# Altium footprint library MyPcb.PcbLib: 367 footprints (part 7 of 23)
Each footprint in its own frame and in the unit in brackets; x right, y up, seen from the top. Pads: shape width x height; smd on the part's side, far side on the other; paste and mask are expansions set on the pad; w line width, h text height; cw(c..) or ccw(c..) is an arc to the next point about the centre after c.
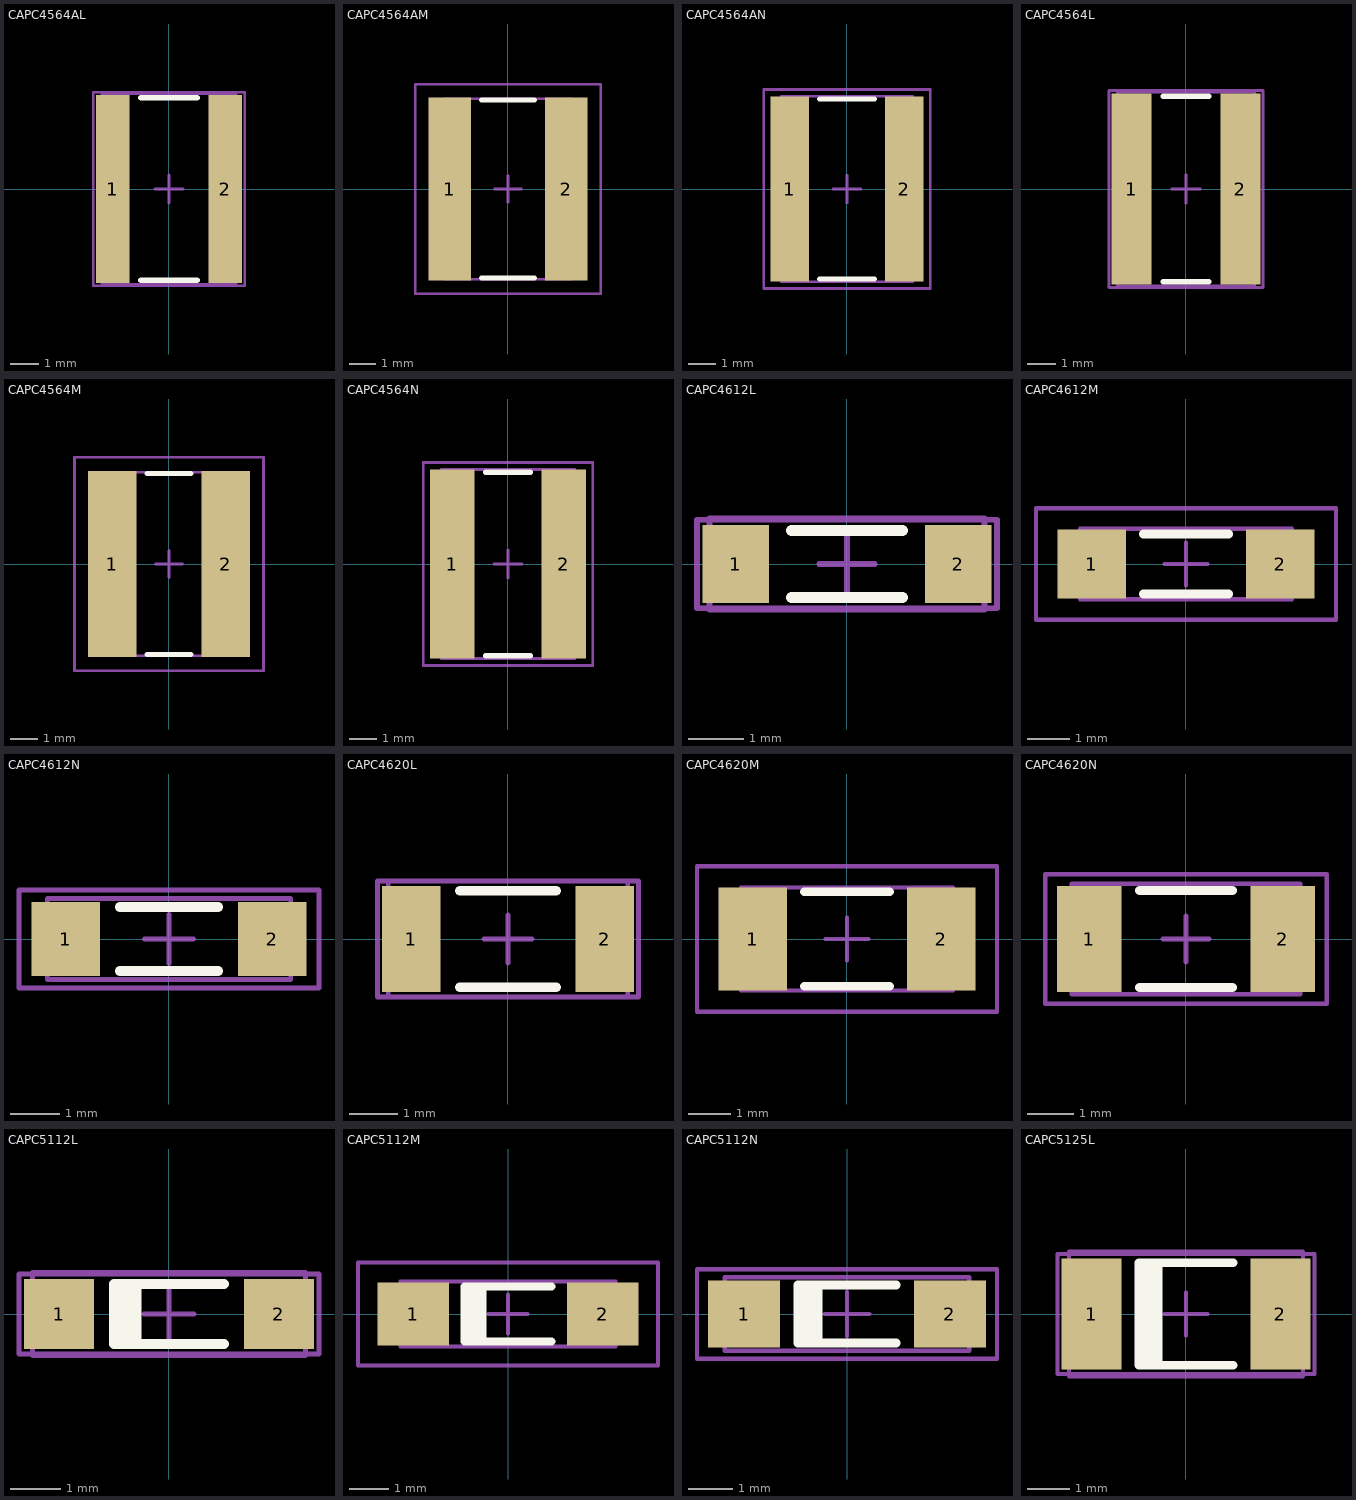
[diagram p6: the footprints below, top view; thin cyan lines are the x and y axes]

## CAPC4564AL [mm] "Chip Capacitor, Body 4.5x6.4mm, IPC High Density"
height 2.03
pads (2):
  rect 1.2x6.7 smd: 1(-2,0) 2(2,0)
Top Overlay:
  lines w0.2: -1,-3.25 1,-3.25 ; -1,3.25 1,3.25
Mechanical 13:
  lines w0.1: -2.4,-3.4 -2.4,3.4 2.4,3.4 2.4,-3.4 -2.4,-3.4
Mechanical 15:
  lines w0.1: -0.5,0 0.5,0 ; 0,-0.5 0,0.5 ; -2.7,-3.45 -2.7,3.45 2.7,3.45 2.7,-3.45 -2.7,-3.45
3D body: height 2.03, standoff 0, extent -2.4,-3.4 2.4,3.4

## CAPC4564AM [mm] "Chip Capacitor, Body 4.5x6.4mm, IPC Low Density"
height 2.03
pads (2):
  rect 1.6x6.9 smd: 1(-2.2,0) 2(2.2,0)
Top Overlay:
  lines w0.2: -1,-3.35 1,-3.35 ; -1,3.35 1,3.35
Mechanical 13:
  lines w0.1: -2.4,-3.4 -2.4,3.4 2.4,3.4 2.4,-3.4 -2.4,-3.4
Mechanical 15:
  lines w0.1: -0.5,0 0.5,0 ; 0,-0.5 0,0.5 ; -3.5,-3.95 -3.5,3.95 3.5,3.95 3.5,-3.95 -3.5,-3.95
3D body: height 2.03, standoff 0, extent -2.4,-3.4 2.4,3.4

## CAPC4564AN [mm] "Chip Capacitor, Body 4.5x6.4mm, IPC Medium Density"
height 2.03
pads (2):
  rect 1.4x6.8 smd: 1(-2.1,0) 2(2.1,0)
Top Overlay:
  lines w0.2: -1,-3.3 1,-3.3 ; -1,3.3 1,3.3
Mechanical 13:
  lines w0.1: -2.4,-3.4 2.4,-3.4 2.4,3.4 -2.4,3.4 -2.4,-3.4
Mechanical 15:
  lines w0.1: -0.5,0 0.5,0 ; 0,-0.5 0,0.5 ; -3.05,-3.65 3.05,-3.65 3.05,3.65 -3.05,3.65 -3.05,-3.65
3D body: height 2.03, standoff 0, extent -2.4,-3.4 2.4,3.4

## CAPC4564L [mm] "Chip Capacitor, Body 4.5x6.4mm, IPC High Density"
height 1.1
pads (2):
  rect 1.4x6.7 smd: 1(-1.9,0) 2(1.9,0)
Top Overlay:
  lines w0.2: -0.8,-3.25 0.8,-3.25 ; -0.8,3.25 0.8,3.25
Mechanical 13:
  lines w0.1: -2.4,-3.4 -2.4,3.4 2.4,3.4 2.4,-3.4 -2.4,-3.4
Mechanical 15:
  lines w0.1: -0.5,0 0.5,0 ; 0,-0.5 0,0.5 ; -2.7,-3.45 -2.7,3.45 2.7,3.45 2.7,-3.45 -2.7,-3.45
3D body: height 1.1, standoff 0, extent -2.4,-3.4 2.4,3.4

## CAPC4564M [mm] "Chip Capacitor, Body 4.5x6.4mm, IPC Low Density"
height 1.1
pads (2):
  rect 1.8x6.9 smd: 1(-2.1,0) 2(2.1,0)
Top Overlay:
  lines w0.2: -0.8,-3.35 0.8,-3.35 ; -0.8,3.35 0.8,3.35
Mechanical 13:
  lines w0.1: -2.4,-3.4 2.4,-3.4 2.4,3.4 -2.4,3.4 -2.4,-3.4
Mechanical 15:
  lines w0.1: -0.5,0 0.5,0 ; 0,-0.5 0,0.5 ; -3.5,-3.95 3.5,-3.95 3.5,3.95 -3.5,3.95 -3.5,-3.95
3D body: height 1.1, standoff 0, extent -2.4,-3.4 2.4,3.4

## CAPC4564N [mm] "Chip Capacitor, Body 4.5x6.4mm, IPC Medium Density"
height 1.1
pads (2):
  rect 1.6x6.8 smd: 1(-2,0) 2(2,0)
Top Overlay:
  lines w0.2: -0.8,-3.3 0.8,-3.3 ; -0.8,3.3 0.8,3.3
Mechanical 13:
  lines w0.1: -2.4,-3.4 2.4,-3.4 2.4,3.4 -2.4,3.4 -2.4,-3.4
Mechanical 15:
  lines w0.1: -0.5,0 0.5,0 ; 0,-0.5 0,0.5 ; -3.05,-3.65 3.05,-3.65 3.05,3.65 -3.05,3.65 -3.05,-3.65
3D body: height 1.1, standoff 0, extent -2.4,-3.4 2.4,3.4

## CAPC4612L [mm] "Chip Capacitor, Body 4.57x1.27mm, IPC High Density"
height 1.4
pads (2):
  rect 1.2x1.4 smd: 1(-2,0) 2(2,0)
Top Overlay:
  lines w0.2: -1,-0.6 1,-0.6 ; -1,0.6 1,0.6
Mechanical 13:
  lines w0.1: -2.475,-0.825 -2.475,0.825 2.475,0.825 2.475,-0.825 -2.475,-0.825
Mechanical 15:
  lines w0.1: -0.5,0 0.5,0 ; 0,-0.5 0,0.5 ; -2.7,-0.8 -2.7,0.8 2.7,0.8 2.7,-0.8 -2.7,-0.8
3D body: height 1.4, standoff 0, extent -2.475,-0.825 2.475,0.825

## CAPC4612M [mm] "Chip Capacitor, Body 4.57x1.27mm, IPC Low Density"
height 1.4
pads (2):
  rect 1.6x1.6 smd: 1(-2.2,0) 2(2.2,0)
Top Overlay:
  lines w0.2: -1,-0.7 1,-0.7 ; -1,0.7 1,0.7
Mechanical 13:
  lines w0.1: -2.475,-0.825 2.475,-0.825 2.475,0.825 -2.475,0.825 -2.475,-0.825
Mechanical 15:
  lines w0.1: -0.5,0 0.5,0 ; 0,-0.5 0,0.5 ; -3.5,-1.3 3.5,-1.3 3.5,1.3 -3.5,1.3 -3.5,-1.3
3D body: height 1.4, standoff 0, extent -2.475,-0.825 2.475,0.825

## CAPC4612N [mm] "Chip Capacitor, Body 4.57x1.27mm, IPC Medium Density"
height 1.4
pads (2):
  rect 1.4x1.5 smd: 1(-2.1,0) 2(2.1,0)
Top Overlay:
  lines w0.2: -1,-0.65 1,-0.65 ; -1,0.65 1,0.65
Mechanical 13:
  lines w0.1: -2.475,-0.825 2.475,-0.825 2.475,0.825 -2.475,0.825 -2.475,-0.825
Mechanical 15:
  lines w0.1: -0.5,0 0.5,0 ; 0,-0.5 0,0.5 ; -3.05,-1 3.05,-1 3.05,1 -3.05,1 -3.05,-1
3D body: height 1.4, standoff 0, extent -2.475,-0.825 2.475,0.825

## CAPC4620L [mm] "Chip Capacitor, Body 4.6x2.0mm, IPC High Density"
height 2.03
pads (2):
  rect 1.2x2.2 smd: 1(-2,0) 2(2,0)
Top Overlay:
  lines w0.2: -1,-1 1,-1 ; -1,1 1,1
Mechanical 13:
  lines w0.1: -2.475,-1.2 2.475,-1.2 2.475,1.2 -2.475,1.2 -2.475,-1.2
Mechanical 15:
  lines w0.1: -0.5,0 0.5,0 ; 0,-0.5 0,0.5 ; -2.7,-1.2 2.7,-1.2 2.7,1.2 -2.7,1.2 -2.7,-1.2
3D body: height 2.03, standoff 0, extent -2.475,-1.2 2.475,1.2

## CAPC4620M [mm] "Chip Capacitor, Body 4.6x2.0mm, IPC Low Density"
height 2.03
pads (2):
  rect 1.6x2.4 smd: 1(-2.2,0) 2(2.2,0)
Top Overlay:
  lines w0.2: -1,-1.1 1,-1.1 ; -1,1.1 1,1.1
Mechanical 13:
  lines w0.1: -2.475,-1.2 -2.475,1.2 2.475,1.2 2.475,-1.2 -2.475,-1.2
Mechanical 15:
  lines w0.1: -0.5,0 0.5,0 ; 0,-0.5 0,0.5 ; -3.5,-1.7 -3.5,1.7 3.5,1.7 3.5,-1.7 -3.5,-1.7
3D body: height 2.03, standoff 0, extent -2.475,-1.2 2.475,1.2

## CAPC4620N [mm] "Chip Capacitor, Body 4.6x2.0mm, IPC Medium Density"
height 2.03
pads (2):
  rect 1.4x2.3 smd: 1(-2.1,0) 2(2.1,0)
Top Overlay:
  lines w0.2: -1,-1.05 1,-1.05 ; -1,1.05 1,1.05
Mechanical 13:
  lines w0.1: -2.475,-1.2 2.475,-1.2 2.475,1.2 -2.475,1.2 -2.475,-1.2
Mechanical 15:
  lines w0.1: -0.5,0 0.5,0 ; 0,-0.5 0,0.5 ; -3.05,-1.4 3.05,-1.4 3.05,1.4 -3.05,1.4 -3.05,-1.4
3D body: height 2.03, standoff 0, extent -2.475,-1.2 2.475,1.2

## CAPC5112L [mm] "Chip Capacitor, Body 5.08x1.27mm, IPC High Density"
height 1.66
pads (2):
  rect 1.4x1.4 smd: 1(-2.2,0) 2(2.2,0)
Top Overlay:
  rectangle: -1.1,-0.6 -0.55,0.6
  lines w0.2: 1.1,-0.6 -1.1,-0.6 -1.1,0.6 1.1,0.6
Mechanical 13:
  lines w0.1: -2.73,-0.825 -2.73,0.825 2.73,0.825 2.73,-0.825 -2.73,-0.825
Mechanical 15:
  lines w0.1: -0.5,0 0.5,0 ; 0,-0.5 0,0.5 ; -3,-0.8 -3,0.8 3,0.8 3,-0.8 -3,-0.8
3D body: height 1.66, standoff 0, extent -2.73,-0.825 2.73,0.825

## CAPC5112M [mm] "Chip Capacitor, Body 5.08x1.27mm, IPC Low Density"
height 1.66
pads (2):
  rect 1.8x1.6 smd: 1(-2.4,0) 2(2.4,0)
Top Overlay:
  rectangle: -1.1,-0.7 -0.55,0.7
  lines w0.2: 1.1,-0.7 -1.1,-0.7 -1.1,0.7 1.1,0.7
Mechanical 13:
  lines w0.1: -2.73,-0.825 2.73,-0.825 2.73,0.825 -2.73,0.825 -2.73,-0.825
Mechanical 15:
  lines w0.1: -0.5,0 0.5,0 ; 0,-0.5 0,0.5 ; -3.8,-1.3 3.8,-1.3 3.8,1.3 -3.8,1.3 -3.8,-1.3
3D body: height 1.66, standoff 0, extent -2.73,-0.825 2.73,0.825

## CAPC5112N [mm] "Chip Capacitor, Body 5.08x1.27mm, IPC Medium Density"
height 1.66
pads (2):
  rect 1.6x1.5 smd: 1(-2.3,0) 2(2.3,0)
Top Overlay:
  rectangle: -1.1,-0.65 -0.55,0.65
  lines w0.2: 1.1,-0.65 -1.1,-0.65 -1.1,0.65 1.1,0.65
Mechanical 13:
  lines w0.1: -2.73,-0.825 2.73,-0.825 2.73,0.825 -2.73,0.825 -2.73,-0.825
Mechanical 15:
  lines w0.1: -0.5,0 0.5,0 ; 0,-0.5 0,0.5 ; -3.35,-1 3.35,-1 3.35,1 -3.35,1 -3.35,-1
3D body: height 1.66, standoff 0, extent -2.73,-0.825 2.73,0.825

## CAPC5125L [mm] "Chip Capacitor, Body 5.08x2.54mm, IPC High Density"
height 1.66
pads (2):
  rect 1.4x2.6 smd: 1(-2.2,0) 2(2.2,0)
Top Overlay:
  rectangle: -1.1,-1.2 -0.55,1.2
  lines w0.2: 1.1,-1.2 -1.1,-1.2 -1.1,1.2 1.1,1.2
Mechanical 13:
  lines w0.1: -2.73,-1.45 -2.73,1.45 2.73,1.45 2.73,-1.45 -2.73,-1.45
Mechanical 15:
  lines w0.1: -0.5,0 0.5,0 ; 0,-0.5 0,0.5 ; -3,-1.4 -3,1.4 3,1.4 3,-1.4 -3,-1.4
3D body: height 1.66, standoff 0, extent -2.73,-1.45 2.73,1.45